# Altium footprint library SAMTEC THD.PcbLib: 161 footprints (part 6 of 12)
Each footprint in its own frame and in the unit in brackets; x right, y up, seen from the top. Pads: shape width x height; smd on the part's side, far side on the other; paste and mask are expansions set on the pad; w line width, h text height; cw(c..) or ccw(c..) is an arc to the next point about the centre after c.
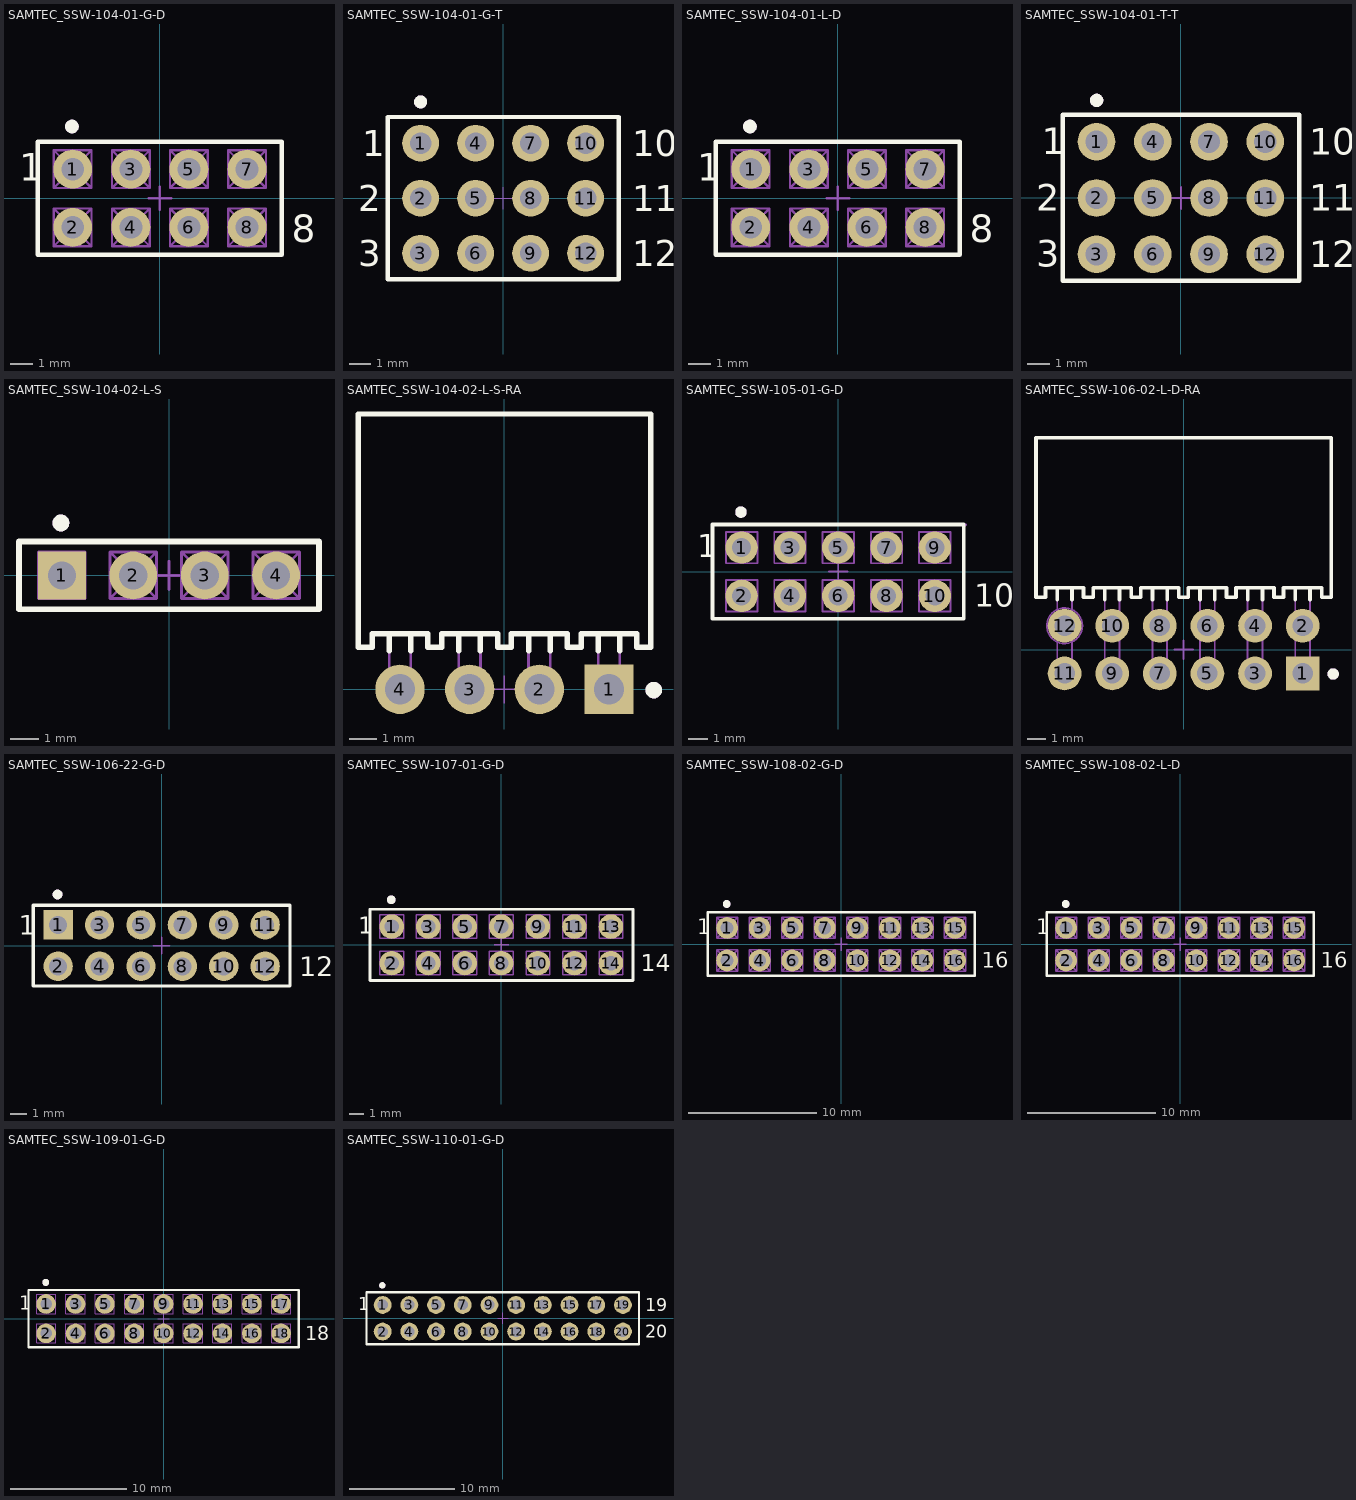
[diagram p5: the footprints below, top view; thin cyan lines are the x and y axes]

## SAMTEC_SSW-104-01-G-D [mm] "8 Contacts, Pitch 2.54mm - Top Entry, Dual Row, Through Mount Straigh Socket"
height 8.51
pads (8):
  round 1.7 hole 1: 1(-3.81,1.27) 2(-3.81,-1.27) 3(-1.27,1.27) 4(-1.27,-1.27) 5(1.27,1.27) 6(1.27,-1.27) 7(3.81,1.27) 8(3.81,-1.27)
Top Overlay:
  circle w0.3: c-3.845,3.135 r0.15
  lines w0.2: -5.334,-2.477 -5.334,2.477 5.334,2.477 5.334,-2.477 -5.334,-2.477
  text "8" at 5.755,-1.925 h1.2
  text "1" at -6.157,0.772 h1.2
Mechanical 8:
  lines w0.1: -4.31,-1.27 -3.81,-1.27 ; -4.31,1.27 -3.81,1.27 ; -3.81,-1.77 -3.81,-1.27 ; -3.81,-0.77 -3.81,-1.27 ; -3.81,0.77 -3.81,1.27 ; -3.81,1.77 -3.81,1.27 ; -3.31,-1.27 -3.81,-1.27 ; -3.31,1.27 -3.81,1.27 ; -1.77,-1.27 -1.27,-1.27 ; -1.77,1.27 -1.27,1.27 ; -1.27,-1.77 -1.27,-1.27 ; -1.27,-0.77 -1.27,-1.27 ; -1.27,0.77 -1.27,1.27 ; -1.27,1.77 -1.27,1.27 ; -0.77,-1.27 -1.27,-1.27 ; -0.77,1.27 -1.27,1.27 ; -0.5,0 0,0 ; 0,-0.5 0,0 ; 0,0.5 0,0 ; 0.5,0 0,0 ; 0.77,-1.27 1.27,-1.27 ; 0.77,1.27 1.27,1.27 ; 1.27,-1.77 1.27,-1.27 ; 1.27,-0.77 1.27,-1.27 ; 1.27,0.77 1.27,1.27 ; 1.27,1.77 1.27,1.27 ; 1.77,-1.27 1.27,-1.27 ; 1.77,1.27 1.27,1.27 ; 3.31,-1.27 3.81,-1.27 ; 3.31,1.27 3.81,1.27 ; 3.81,-1.77 3.81,-1.27 ; 3.81,-0.77 3.81,-1.27 ; 3.81,0.77 3.81,1.27 ; 3.81,1.77 3.81,1.27 ; 4.31,-1.27 3.81,-1.27 ; 4.31,1.27 3.81,1.27
Mechanical 14:
  circle w0.3: c-3.845,3.135 r0.15
  lines w0.1: -4.636,-2.095 -2.985,-2.095 ; -4.636,-2.095 -4.204,-1.664 ; -4.636,-2.095 -4.636,-0.445 ; -4.636,-0.445 -2.985,-0.445 ; -4.636,-0.445 -4.204,-0.876 ; -4.636,0.445 -2.985,0.445 ; -4.636,0.445 -4.204,0.876 ; -4.636,0.445 -4.636,2.095 ; -4.636,2.095 -2.985,2.095 ; -4.636,2.095 -4.204,1.664 ; -4.204,-1.664 -3.416,-1.664 ; -4.204,-1.664 -4.204,-0.876 ; -4.204,-0.876 -3.416,-0.876 ; -4.204,0.876 -3.416,0.876 ; -4.204,0.876 -4.204,1.664 ; -4.204,1.664 -3.416,1.664 ; -3.416,-1.664 -2.985,-2.095 ; -3.416,-1.664 -3.416,-0.876 ; -3.416,-0.876 -2.985,-0.445 ; -3.416,0.876 -2.985,0.445 ; -3.416,0.876 -3.416,1.664 ; -3.416,1.664 -2.985,2.095 ; -2.985,-2.095 -2.985,-0.445 ; -2.985,0.445 -2.985,2.095 ; -2.095,-2.095 -0.445,-2.095 ; -2.095,-2.095 -1.664,-1.664 ; -2.095,-2.095 -2.095,-0.445 ; -2.095,-0.445 -0.445,-0.445 ; -2.095,-0.445 -1.664,-0.876 ; -2.095,0.445 -0.445,0.445 ; -2.095,0.445 -1.664,0.876 ; -2.095,0.445 -2.095,2.095 ; -2.095,2.095 -0.445,2.095 ; -2.095,2.095 -1.664,1.664 ; -1.664,-1.664 -0.876,-1.664 ; -1.664,-1.664 -1.664,-0.876 ; -1.664,-0.876 -0.876,-0.876 ; -1.664,0.876 -0.876,0.876 ; -1.664,0.876 -1.664,1.664 ; -1.664,1.664 -0.876,1.664 ; -0.876,-1.664 -0.445,-2.095 ; -0.876,-1.664 -0.876,-0.876 ; -0.876,-0.876 -0.445,-0.445 ; -0.876,0.876 -0.445,0.445 ; -0.876,0.876 -0.876,1.664 ; -0.876,1.664 -0.445,2.095 ; -0.445,-2.095 -0.445,-0.445 ; -0.445,0.445 -0.445,2.095 ; 0.445,-2.095 2.095,-2.095 ; 0.445,-2.095 0.876,-1.664 ; 0.445,-2.095 0.445,-0.445 ; 0.445,-0.445 2.095,-0.445 ; 0.445,-0.445 0.876,-0.876 ; 0.445,0.445 2.095,0.445 ; 0.445,0.445 0.876,0.876 ; 0.445,0.445 0.445,2.095 ; 0.445,2.095 2.095,2.095 ; 0.445,2.095 0.876,1.664 ; 0.876,-1.664 1.664,-1.664 ; 0.876,-1.664 0.876,-0.876 ; 0.876,-0.876 1.664,-0.876 ; 0.876,0.876 1.664,0.876 ; 0.876,0.876 0.876,1.664 ; 0.876,1.664 1.664,1.664 ; 1.664,-1.664 2.095,-2.095 ; 1.664,-1.664 1.664,-0.876 ; 1.664,-0.876 2.095,-0.445 ; 1.664,0.876 2.095,0.445 ; 1.664,0.876 1.664,1.664 ; 1.664,1.664 2.095,2.095 ; 2.095,-2.095 2.095,-0.445 ; 2.095,0.445 2.095,2.095 ; 2.985,-2.095 4.636,-2.095 ; 2.985,-2.095 3.416,-1.664 ; 2.985,-2.095 2.985,-0.445 ; 2.985,-0.445 4.636,-0.445 ; 2.985,-0.445 3.416,-0.876 ; 2.985,0.445 4.636,0.445 ; 2.985,0.445 3.416,0.876 ; 2.985,0.445 2.985,2.095 ; 2.985,2.095 4.636,2.095 ; 2.985,2.095 3.416,1.664 ; 3.416,-1.664 4.204,-1.664 ; 3.416,-1.664 3.416,-0.876 ; 3.416,-0.876 4.204,-0.876 ; 3.416,0.876 4.204,0.876 ; 3.416,0.876 3.416,1.664 ; 3.416,1.664 4.204,1.664 ; 4.204,-1.664 4.636,-2.095 ; 4.204,-1.664 4.204,-0.876 ; 4.204,-0.876 4.636,-0.445 ; 4.204,0.876 4.636,0.445 ; 4.204,0.876 4.204,1.664 ; 4.204,1.664 4.636,2.095 ; 4.636,-2.095 4.636,-0.445 ; 4.636,0.445 4.636,2.095 ; -5.334,-2.477 -5.334,2.477 5.334,2.477 5.334,-2.477 -5.334,-2.477
  text "8" at 5.755,-1.925 h1.2
  text "1" at -6.157,0.772 h1.2
3D body "SAMTEC_SSW-104-01-G-D.stp": height 8.51, standoff -2.64, extent -5.334,-2.476 5.334,2.477

## SAMTEC_SSW-104-01-G-T [mm] "12 Contacts, Pitch 2.54mm, Triple Row Through Mount Straight Socket (Lead Length 2.64mm)"
height 8.51
pads (12):
  round 1.7 hole 1: 1(-3.81,2.54) 2(-3.81,0) 3(-3.81,-2.54) 4(-1.27,2.54) 5(-1.27,0) 6(-1.27,-2.54) 7(1.27,2.54) 8(1.27,0) 9(1.27,-2.54) 10(3.81,2.54) 11(3.81,0) 12(3.81,-2.54)
Top Overlay:
  circle w0.3: c-3.81,4.447 r0.15
  lines w0.2: -5.334,-3.746 5.334,-3.746 5.334,3.746 -5.334,3.746 -5.334,-3.746
  text "10" at 5.95,1.94 h1.2
  text "11" at 5.95,-0.6 h1.2
  text "12" at 5.95,-3.14 h1.2
  text "3" at -6.7,-3.14 h1.2
  text "2" at -6.7,-0.6 h1.2
  text "1" at -6.5,1.94 h1.2
Mechanical 8:
  lines w0.05: -4.31,-2.54 -3.81,-2.54 ; -4.31,0 -3.81,0 ; -4.31,2.54 -3.81,2.54 ; -3.81,-3.04 -3.81,-2.54 ; -3.81,-2.04 -3.81,-2.54 ; -3.81,-0.5 -3.81,0 ; -3.81,0.5 -3.81,0 ; -3.81,2.04 -3.81,2.54 ; -3.81,3.04 -3.81,2.54 ; -3.31,-2.54 -3.81,-2.54 ; -3.31,0 -3.81,0 ; -3.31,2.54 -3.81,2.54 ; -1.77,-2.54 -1.27,-2.54 ; -1.77,0 -1.27,0 ; -1.77,2.54 -1.27,2.54 ; -1.27,-3.04 -1.27,-2.54 ; -1.27,-2.04 -1.27,-2.54 ; -1.27,-0.5 -1.27,0 ; -1.27,0.5 -1.27,0 ; -1.27,2.04 -1.27,2.54 ; -1.27,3.04 -1.27,2.54 ; -0.77,-2.54 -1.27,-2.54 ; -0.77,0 -1.27,0 ; -0.77,2.54 -1.27,2.54 ; -0.5,0 0,0 ; 0,-0.5 0,0 ; 0,0.5 0,0 ; 0.5,0 0,0 ; 0.77,-2.54 1.27,-2.54 ; 0.77,0 1.27,0 ; 0.77,2.54 1.27,2.54 ; 1.27,-3.04 1.27,-2.54 ; 1.27,-2.04 1.27,-2.54 ; 1.27,-0.5 1.27,0 ; 1.27,0.5 1.27,0 ; 1.27,2.04 1.27,2.54 ; 1.27,3.04 1.27,2.54 ; 1.77,-2.54 1.27,-2.54 ; 1.77,0 1.27,0 ; 1.77,2.54 1.27,2.54 ; 3.31,-2.54 3.81,-2.54 ; 3.31,0 3.81,0 ; 3.31,2.54 3.81,2.54 ; 3.81,-3.04 3.81,-2.54 ; 3.81,-2.04 3.81,-2.54 ; 3.81,-0.5 3.81,0 ; 3.81,0.5 3.81,0 ; 3.81,2.04 3.81,2.54 ; 3.81,3.04 3.81,2.54 ; 4.31,-2.54 3.81,-2.54 ; 4.31,0 3.81,0 ; 4.31,2.54 3.81,2.54
Mechanical 14:
  circle w0.3: c-3.81,4.447 r0.15
  lines w0.1: -5.334,-3.746 5.334,-3.746 5.334,3.746 -5.334,3.746 -5.334,-3.746 ; -4.204,-2.934 -3.416,-2.934 -3.416,-2.146 -4.204,-2.146 -4.204,-2.934 ; -4.204,-0.394 -3.416,-0.394 -3.416,0.394 -4.204,0.394 -4.204,-0.394 ; -4.204,2.146 -3.416,2.146 -3.416,2.934 -4.204,2.934 -4.204,2.146 ; -1.664,-2.934 -0.876,-2.934 -0.876,-2.146 -1.664,-2.146 -1.664,-2.934 ; -1.664,-0.394 -0.876,-0.394 -0.876,0.394 -1.664,0.394 -1.664,-0.394 ; -1.664,2.146 -0.876,2.146 -0.876,2.934 -1.664,2.934 -1.664,2.146 ; 0.876,-2.934 1.664,-2.934 1.664,-2.146 0.876,-2.146 0.876,-2.934 ; 0.876,-0.394 1.664,-0.394 1.664,0.394 0.876,0.394 0.876,-0.394 ; 0.876,2.146 1.664,2.146 1.664,2.934 0.876,2.934 0.876,2.146 ; 3.416,-2.934 4.204,-2.934 4.204,-2.146 3.416,-2.146 3.416,-2.934 ; 3.416,-0.394 4.204,-0.394 4.204,0.394 3.416,0.394 3.416,-0.394 ; 3.416,2.146 4.204,2.146 4.204,2.934 3.416,2.934 3.416,2.146
  text "1" at -6.5,1.94 h1.2
3D body "SAMTEC_SSW-104-01-G-T.stp": height 8.51, standoff -2.64, extent -5.334,-3.746 5.334,3.747

## SAMTEC_SSW-104-01-L-D [mm] "8 Contacts, Pitch 2.54mm - Top Entry, Dual Row, Through Mount Straigh Socket"
height 8.51
pads (8):
  round 1.7 hole 1: 1(-3.81,1.27) 2(-3.81,-1.27) 3(-1.27,1.27) 4(-1.27,-1.27) 5(1.27,1.27) 6(1.27,-1.27) 7(3.81,1.27) 8(3.81,-1.27)
Top Overlay:
  circle w0.3: c-3.845,3.135 r0.15
  lines w0.2: -5.334,-2.477 5.334,-2.477 5.334,2.477 -5.334,2.477 -5.334,-2.477
  text "1" at -6.157,0.772 h1.2
  text "8" at 5.755,-1.925 h1.2
Mechanical 8:
  lines w0.1: -4.31,-1.27 -3.81,-1.27 ; -4.31,1.27 -3.81,1.27 ; -3.81,-1.77 -3.81,-1.27 ; -3.81,-0.77 -3.81,-1.27 ; -3.81,0.77 -3.81,1.27 ; -3.81,1.77 -3.81,1.27 ; -3.31,-1.27 -3.81,-1.27 ; -3.31,1.27 -3.81,1.27 ; -1.77,-1.27 -1.27,-1.27 ; -1.77,1.27 -1.27,1.27 ; -1.27,-1.77 -1.27,-1.27 ; -1.27,-0.77 -1.27,-1.27 ; -1.27,0.77 -1.27,1.27 ; -1.27,1.77 -1.27,1.27 ; -0.77,-1.27 -1.27,-1.27 ; -0.77,1.27 -1.27,1.27 ; -0.5,0 0,0 ; 0,-0.5 0,0 ; 0,0.5 0,0 ; 0.5,0 0,0 ; 0.77,-1.27 1.27,-1.27 ; 0.77,1.27 1.27,1.27 ; 1.27,-1.77 1.27,-1.27 ; 1.27,-0.77 1.27,-1.27 ; 1.27,0.77 1.27,1.27 ; 1.27,1.77 1.27,1.27 ; 1.77,-1.27 1.27,-1.27 ; 1.77,1.27 1.27,1.27 ; 3.31,-1.27 3.81,-1.27 ; 3.31,1.27 3.81,1.27 ; 3.81,-1.77 3.81,-1.27 ; 3.81,-0.77 3.81,-1.27 ; 3.81,0.77 3.81,1.27 ; 3.81,1.77 3.81,1.27 ; 4.31,-1.27 3.81,-1.27 ; 4.31,1.27 3.81,1.27
Mechanical 14:
  circle w0.3: c-3.845,3.135 r0.15
  lines w0.1: -4.636,-2.095 -4.636,-0.445 ; -4.636,-2.095 -4.204,-1.664 ; -4.636,-2.095 -2.985,-2.095 ; -4.636,-0.445 -4.204,-0.876 ; -4.636,-0.445 -2.985,-0.445 ; -4.636,0.445 -4.636,2.095 ; -4.636,0.445 -4.204,0.876 ; -4.636,0.445 -2.985,0.445 ; -4.636,2.095 -4.204,1.664 ; -4.636,2.095 -2.985,2.095 ; -4.204,-1.664 -4.204,-0.876 ; -4.204,-1.664 -3.416,-1.664 ; -4.204,-0.876 -3.416,-0.876 ; -4.204,0.876 -4.204,1.664 ; -4.204,0.876 -3.416,0.876 ; -4.204,1.664 -3.416,1.664 ; -3.416,-1.664 -3.416,-0.876 ; -3.416,-1.664 -2.985,-2.095 ; -3.416,-0.876 -2.985,-0.445 ; -3.416,0.876 -3.416,1.664 ; -3.416,0.876 -2.985,0.445 ; -3.416,1.664 -2.985,2.095 ; -2.985,-2.095 -2.985,-0.445 ; -2.985,0.445 -2.985,2.095 ; -2.095,-2.095 -2.095,-0.445 ; -2.095,-2.095 -1.664,-1.664 ; -2.095,-2.095 -0.445,-2.095 ; -2.095,-0.445 -1.664,-0.876 ; -2.095,-0.445 -0.445,-0.445 ; -2.095,0.445 -2.095,2.095 ; -2.095,0.445 -1.664,0.876 ; -2.095,0.445 -0.445,0.445 ; -2.095,2.095 -1.664,1.664 ; -2.095,2.095 -0.445,2.095 ; -1.664,-1.664 -1.664,-0.876 ; -1.664,-1.664 -0.876,-1.664 ; -1.664,-0.876 -0.876,-0.876 ; -1.664,0.876 -1.664,1.664 ; -1.664,0.876 -0.876,0.876 ; -1.664,1.664 -0.876,1.664 ; -0.876,-1.664 -0.876,-0.876 ; -0.876,-1.664 -0.445,-2.095 ; -0.876,-0.876 -0.445,-0.445 ; -0.876,0.876 -0.876,1.664 ; -0.876,0.876 -0.445,0.445 ; -0.876,1.664 -0.445,2.095 ; -0.445,-2.095 -0.445,-0.445 ; -0.445,0.445 -0.445,2.095 ; 0.445,-2.095 0.445,-0.445 ; 0.445,-2.095 0.876,-1.664 ; 0.445,-2.095 2.095,-2.095 ; 0.445,-0.445 0.876,-0.876 ; 0.445,-0.445 2.095,-0.445 ; 0.445,0.445 0.445,2.095 ; 0.445,0.445 0.876,0.876 ; 0.445,0.445 2.095,0.445 ; 0.445,2.095 0.876,1.664 ; 0.445,2.095 2.095,2.095 ; 0.876,-1.664 0.876,-0.876 ; 0.876,-1.664 1.664,-1.664 ; 0.876,-0.876 1.664,-0.876 ; 0.876,0.876 0.876,1.664 ; 0.876,0.876 1.664,0.876 ; 0.876,1.664 1.664,1.664 ; 1.664,-1.664 1.664,-0.876 ; 1.664,-1.664 2.095,-2.095 ; 1.664,-0.876 2.095,-0.445 ; 1.664,0.876 1.664,1.664 ; 1.664,0.876 2.095,0.445 ; 1.664,1.664 2.095,2.095 ; 2.095,-2.095 2.095,-0.445 ; 2.095,0.445 2.095,2.095 ; 2.985,-2.095 2.985,-0.445 ; 2.985,-2.095 3.416,-1.664 ; 2.985,-2.095 4.636,-2.095 ; 2.985,-0.445 3.416,-0.876 ; 2.985,-0.445 4.636,-0.445 ; 2.985,0.445 2.985,2.095 ; 2.985,0.445 3.416,0.876 ; 2.985,0.445 4.636,0.445 ; 2.985,2.095 3.416,1.664 ; 2.985,2.095 4.636,2.095 ; 3.416,-1.664 3.416,-0.876 ; 3.416,-1.664 4.204,-1.664 ; 3.416,-0.876 4.204,-0.876 ; 3.416,0.876 3.416,1.664 ; 3.416,0.876 4.204,0.876 ; 3.416,1.664 4.204,1.664 ; 4.204,-1.664 4.204,-0.876 ; 4.204,-1.664 4.636,-2.095 ; 4.204,-0.876 4.636,-0.445 ; 4.204,0.876 4.204,1.664 ; 4.204,0.876 4.636,0.445 ; 4.204,1.664 4.636,2.095 ; 4.636,-2.095 4.636,-0.445 ; 4.636,0.445 4.636,2.095 ; -5.334,-2.477 5.334,-2.477 5.334,2.477 -5.334,2.477 -5.334,-2.477
  text "1" at -6.157,0.772 h1.2
  text "8" at 5.755,-1.925 h1.2
3D body "SAMTEC_SSW-104-01-L-D.stp": height 8.51, standoff -2.64, extent -5.334,-2.476 5.334,2.477

## SAMTEC_SSW-104-01-T-T [mm] "12 Contacts - Pitch 2.54mm - Triple Row Through Mount Straigh Socket (Lead Length 2.64mm)"
height 8.51
pads (12):
  round 1.7 hole 1: 1(-3.81,2.54) 2(-3.81,0) 3(-3.81,-2.54) 4(-1.27,2.54) 5(-1.27,0) 6(-1.27,-2.54) 7(1.27,2.54) 8(1.27,0) 9(1.27,-2.54) 10(3.81,2.54) 11(3.81,0) 12(3.81,-2.54)
Top Overlay:
  circle w0.3: c-3.805,4.405 r0.15
  lines w0.2: -5.334,-3.746 5.334,-3.746 5.334,3.746 -5.334,3.746 -5.334,-3.746
  text "12" at 5.8,-3.12 h1.2
  text "3" at -6.542,-3.113 h1.2
  text "11" at 5.8,-0.58 h1.2
  text "2" at -6.542,-0.573 h1.2
  text "10" at 5.8,1.96 h1.2
  text "1" at -6.292,1.967 h1.2
Mechanical 8:
  lines w0.05: -4.31,-2.54 -3.81,-2.54 ; -4.31,0 -3.81,0 ; -4.31,2.54 -3.81,2.54 ; -3.81,-3.04 -3.81,-2.54 ; -3.81,-2.04 -3.81,-2.54 ; -3.81,-0.5 -3.81,0 ; -3.81,0.5 -3.81,0 ; -3.81,2.04 -3.81,2.54 ; -3.81,3.04 -3.81,2.54 ; -3.31,-2.54 -3.81,-2.54 ; -3.31,0 -3.81,0 ; -3.31,2.54 -3.81,2.54 ; -1.77,-2.54 -1.27,-2.54 ; -1.77,0 -1.27,0 ; -1.77,2.54 -1.27,2.54 ; -1.27,-3.04 -1.27,-2.54 ; -1.27,-2.04 -1.27,-2.54 ; -1.27,-0.5 -1.27,0 ; -1.27,0.5 -1.27,0 ; -1.27,2.04 -1.27,2.54 ; -1.27,3.04 -1.27,2.54 ; -0.77,-2.54 -1.27,-2.54 ; -0.77,0 -1.27,0 ; -0.77,2.54 -1.27,2.54 ; 0.77,-2.54 1.27,-2.54 ; 0.77,0 1.27,0 ; 0.77,2.54 1.27,2.54 ; 1.27,-3.04 1.27,-2.54 ; 1.27,-2.04 1.27,-2.54 ; 1.27,-0.5 1.27,0 ; 1.27,0.5 1.27,0 ; 1.27,2.04 1.27,2.54 ; 1.27,3.04 1.27,2.54 ; 1.77,-2.54 1.27,-2.54 ; 1.77,0 1.27,0 ; 1.77,2.54 1.27,2.54 ; 3.31,-2.54 3.81,-2.54 ; 3.31,0 3.81,0 ; 3.31,2.54 3.81,2.54 ; 3.81,-3.04 3.81,-2.54 ; 3.81,-2.04 3.81,-2.54 ; 3.81,-0.5 3.81,0 ; 3.81,0.5 3.81,0 ; 3.81,2.04 3.81,2.54 ; 3.81,3.04 3.81,2.54 ; 4.31,-2.54 3.81,-2.54 ; 4.31,0 3.81,0 ; 4.31,2.54 3.81,2.54
  lines w0.1: -4.31,-2.54 -3.81,-2.54 ; -4.31,0 -3.81,0 ; -4.31,2.54 -3.81,2.54 ; -3.81,-3.04 -3.81,-2.54 ; -3.81,-2.04 -3.81,-2.54 ; -3.81,-0.5 -3.81,0 ; -3.81,0.5 -3.81,0 ; -3.81,2.04 -3.81,2.54 ; -3.81,3.04 -3.81,2.54 ; -3.31,-2.54 -3.81,-2.54 ; -3.31,0 -3.81,0 ; -3.31,2.54 -3.81,2.54 ; -1.77,-2.54 -1.27,-2.54 ; -1.77,0 -1.27,0 ; -1.77,2.54 -1.27,2.54 ; -1.27,-3.04 -1.27,-2.54 ; -1.27,-2.04 -1.27,-2.54 ; -1.27,-0.5 -1.27,0 ; -1.27,0.5 -1.27,0 ; -1.27,2.04 -1.27,2.54 ; -1.27,3.04 -1.27,2.54 ; -0.77,-2.54 -1.27,-2.54 ; -0.77,0 -1.27,0 ; -0.77,2.54 -1.27,2.54 ; -0.5,0 0,0 ; 0,-0.5 0,0 ; 0,0.5 0,0 ; 0.5,0 0,0 ; 0.77,-2.54 1.27,-2.54 ; 0.77,0 1.27,0 ; 0.77,2.54 1.27,2.54 ; 1.27,-3.04 1.27,-2.54 ; 1.27,-2.04 1.27,-2.54 ; 1.27,-0.5 1.27,0 ; 1.27,0.5 1.27,0 ; 1.27,2.04 1.27,2.54 ; 1.27,3.04 1.27,2.54 ; 1.77,-2.54 1.27,-2.54 ; 1.77,0 1.27,0 ; 1.77,2.54 1.27,2.54 ; 3.31,-2.54 3.81,-2.54 ; 3.31,0 3.81,0 ; 3.31,2.54 3.81,2.54 ; 3.81,-3.04 3.81,-2.54 ; 3.81,-2.04 3.81,-2.54 ; 3.81,-0.5 3.81,0 ; 3.81,0.5 3.81,0 ; 3.81,2.04 3.81,2.54 ; 3.81,3.04 3.81,2.54 ; 4.31,-2.54 3.81,-2.54 ; 4.31,0 3.81,0 ; 4.31,2.54 3.81,2.54
Mechanical 14:
  circle w0.3: c-3.805,4.405 r0.15
  lines w0.1: -5.334,-3.746 5.334,-3.746 5.334,3.746 -5.334,3.746 -5.334,-3.746 ; -4.204,-2.934 -3.416,-2.934 -3.416,-2.146 -4.204,-2.146 -4.204,-2.934 ; -4.204,-0.394 -3.416,-0.394 -3.416,0.394 -4.204,0.394 -4.204,-0.394 ; -4.204,2.146 -3.416,2.146 -3.416,2.934 -4.204,2.934 -4.204,2.146 ; -1.664,-2.934 -0.876,-2.934 -0.876,-2.146 -1.664,-2.146 -1.664,-2.934 ; -1.664,-0.394 -0.876,-0.394 -0.876,0.394 -1.664,0.394 -1.664,-0.394 ; -1.664,2.146 -0.876,2.146 -0.876,2.934 -1.664,2.934 -1.664,2.146 ; 0.876,-2.934 1.664,-2.934 1.664,-2.146 0.876,-2.146 0.876,-2.934 ; 0.876,-0.394 1.664,-0.394 1.664,0.394 0.876,0.394 0.876,-0.394 ; 0.876,2.146 1.664,2.146 1.664,2.934 0.876,2.934 0.876,2.146 ; 3.416,-2.934 4.204,-2.934 4.204,-2.146 3.416,-2.146 3.416,-2.934 ; 3.416,-0.394 4.204,-0.394 4.204,0.394 3.416,0.394 3.416,-0.394 ; 3.416,2.146 4.204,2.146 4.204,2.934 3.416,2.934 3.416,2.146
  text "12" at 5.8,-3.12 h1.2
  text "3" at -6.542,-3.113 h1.2
  text "11" at 5.8,-0.58 h1.2
  text "2" at -6.542,-0.573 h1.2
  text "10" at 5.8,1.96 h1.2
  text "1" at -6.292,1.967 h1.2
3D body "SAMTEC_SSW-104-01-T-T.stp": height 8.51, standoff -2.64, extent -5.334,-3.746 5.334,3.747

## SAMTEC_SSW-104-02-L-S [mm] "4 Contacts, Pitch 2.54mm - Top Entry, Single Row, Through Mount Straigh Socket"
height 8.5
pads (4):
  rect 1.7x1.7 hole 1: 1(-3.81,0)
  round 1.7 hole 1: 2(-1.27,0) 3(1.27,0) 4(3.81,0)
Top Overlay:
  circle w0.3: c-3.845,1.865 r0.15
  lines w0.2: -5.334,-1.206 5.334,-1.206 5.334,1.206 -5.334,1.206 -5.334,-1.206
Mechanical 8:
  lines w0.1: -4.31,0 -3.81,0 ; -3.81,-0.5 -3.81,0 ; -3.81,0.5 -3.81,0 ; -3.31,0 -3.81,0 ; -1.77,0 -1.27,0 ; -1.27,-0.5 -1.27,0 ; -1.27,0.5 -1.27,0 ; -0.77,0 -1.27,0 ; -0.5,0 0,0 ; 0,-0.5 0,0 ; 0,0.5 0,0 ; 0.5,0 0,0 ; 0.77,0 1.27,0 ; 1.27,-0.5 1.27,0 ; 1.27,0.5 1.27,0 ; 1.77,0 1.27,0 ; 3.31,0 3.81,0 ; 3.81,-0.5 3.81,0 ; 3.81,0.5 3.81,0 ; 4.31,0 3.81,0
Mechanical 14:
  circle w0.3: c-3.845,1.865 r0.15
  lines w0.1: -4.636,-0.826 -2.985,-0.826 ; -4.636,-0.826 -4.636,0.826 ; -4.636,-0.826 -4.204,-0.394 ; -4.636,0.826 -2.985,0.826 ; -4.636,0.826 -4.204,0.394 ; -4.204,-0.394 -3.416,-0.394 ; -4.204,-0.394 -4.204,0.394 ; -4.204,0.394 -3.416,0.394 ; -3.416,-0.394 -3.416,0.394 ; -3.416,-0.394 -2.985,-0.826 ; -3.416,0.394 -2.985,0.826 ; -2.985,-0.826 -2.985,0.826 ; -2.095,-0.826 -0.445,-0.826 ; -2.095,-0.826 -2.095,0.826 ; -2.095,-0.826 -1.664,-0.394 ; -2.095,0.826 -0.445,0.826 ; -2.095,0.826 -1.664,0.394 ; -1.664,-0.394 -0.876,-0.394 ; -1.664,-0.394 -1.664,0.394 ; -1.664,0.394 -0.876,0.394 ; -0.876,-0.394 -0.876,0.394 ; -0.876,-0.394 -0.445,-0.826 ; -0.876,0.394 -0.445,0.826 ; -0.445,-0.826 -0.445,0.826 ; 0.445,-0.826 2.095,-0.826 ; 0.445,-0.826 0.445,0.826 ; 0.445,-0.826 0.876,-0.394 ; 0.445,0.826 2.095,0.826 ; 0.445,0.826 0.876,0.394 ; 0.876,-0.394 1.664,-0.394 ; 0.876,-0.394 0.876,0.394 ; 0.876,0.394 1.664,0.394 ; 1.664,-0.394 1.664,0.394 ; 1.664,-0.394 2.095,-0.826 ; 1.664,0.394 2.095,0.826 ; 2.095,-0.826 2.095,0.826 ; 2.985,-0.826 4.636,-0.826 ; 2.985,-0.826 2.985,0.826 ; 2.985,-0.826 3.416,-0.394 ; 2.985,0.826 4.636,0.826 ; 2.985,0.826 3.416,0.394 ; 3.416,-0.394 4.204,-0.394 ; 3.416,-0.394 3.416,0.394 ; 3.416,0.394 4.204,0.394 ; 4.204,-0.394 4.204,0.394 ; 4.204,-0.394 4.636,-0.826 ; 4.204,0.394 4.636,0.826 ; 4.636,-0.826 4.636,0.826 ; -5.334,-1.206 5.334,-1.206 5.334,1.206 -5.334,1.206 -5.334,-1.206
3D body "SAMTEC_SSW-104-02-L-S.stp": height 8.51, standoff -4.93, extent -5.334,-1.206 5.334,1.207

## SAMTEC_SSW-104-02-L-S-RA [mm] "4 Contacts, Pitch 2.54mm, Single Row Through Mount Right Angle Socket (Lead Length 2.54mm)"
height 2.41
pads (4):
  rect 1.8x1.8 hole 1.1: 1(3.81,0)
  round 1.8 hole 1.1: 2(1.27,0) 3(-1.27,0) 4(-3.81,0)
Top Overlay:
  circle w0.3: c5.439,-0.03 r0.15
  lines w0.2: -4.204,1.4 -4.204,2.032 ; -3.416,1.4 -3.416,2.032 ; -1.664,1.4 -1.664,2.032 ; -0.876,1.4 -0.876,2.032 ; 0.876,1.4 0.876,2.032 ; 1.664,1.4 1.664,2.032 ; 3.416,1.4 3.416,2.032 ; 4.204,1.4 4.204,2.032 ; -5.334,1.524 -4.826,1.524 -4.826,2.032 -2.794,2.032 -2.794,1.524 -2.286,1.524 -2.286,2.032 -0.254,2.032 -0.254,1.524 0.254,1.524 0.254,2.032 2.286,2.032 2.286,1.524 2.794,1.524 2.794,2.032 4.826,2.032 4.826,1.524 5.334,1.524 5.334,10.033 -5.334,10.033 -5.334,1.524
Mechanical 8:
  lines w0.05: -4.31,0 -3.81,0 ; -3.81,-0.5 -3.81,0 ; -3.81,0.5 -3.81,0 ; -3.31,0 -3.81,0 ; -1.77,0 -1.27,0 ; -1.27,-0.5 -1.27,0 ; -1.27,0.5 -1.27,0 ; -0.77,0 -1.27,0 ; -0.5,0 0,0 ; 0,-0.5 0,0 ; 0,0.5 0,0 ; 0.5,0 0,0 ; 0.77,0 1.27,0 ; 1.27,-0.5 1.27,0 ; 1.27,0.5 1.27,0 ; 1.77,0 1.27,0 ; 3.31,0 3.81,0 ; 3.81,-0.5 3.81,0 ; 3.81,0.5 3.81,0 ; 4.31,0 3.81,0
Mechanical 14:
  circle w0.3: c5.439,-0.03 r0.15
  lines w0.1: -4.204,2.032 -4.204,-0.203 -3.416,-0.203 -3.416,2.032 ; -1.664,2.032 -1.664,-0.203 -0.876,-0.203 -0.876,2.032 ; 0.876,-0.203 0.876,2.032 ; 0.876,-0.2 1.664,-0.2 ; 1.664,-0.203 1.664,2.032 ; 3.416,2.032 3.416,-0.203 4.204,-0.203 4.204,2.032 ; -5.334,1.524 -4.826,1.524 -4.826,2.032 -2.794,2.032 -2.794,1.524 -2.286,1.524 -2.286,2.032 -0.254,2.032 -0.254,1.524 0.254,1.524 0.254,2.032 2.286,2.032 2.286,1.524 2.794,1.524 2.794,2.032 4.826,2.032 4.826,1.524 5.334,1.524 5.334,10.033 -5.334,10.033 -5.334,1.524
3D body "SAMTEC_SSW-104-02-L-S-RA.stp": height 2.41, standoff -2.53, extent -5.334,-0.203 5.334,10.033
